# Altium footprint library LimeMicroAltiumLib_pcbLib_r05.PcbLib: 746 footprints (part 25 of 48)
Each footprint in its own frame and in the unit in brackets; x right, y up, seen from the top. Pads: shape width x height; smd on the part's side, far side on the other; paste and mask are expansions set on the pad; w line width, h text height; cw(c..) or ccw(c..) is an arc to the next point about the centre after c.
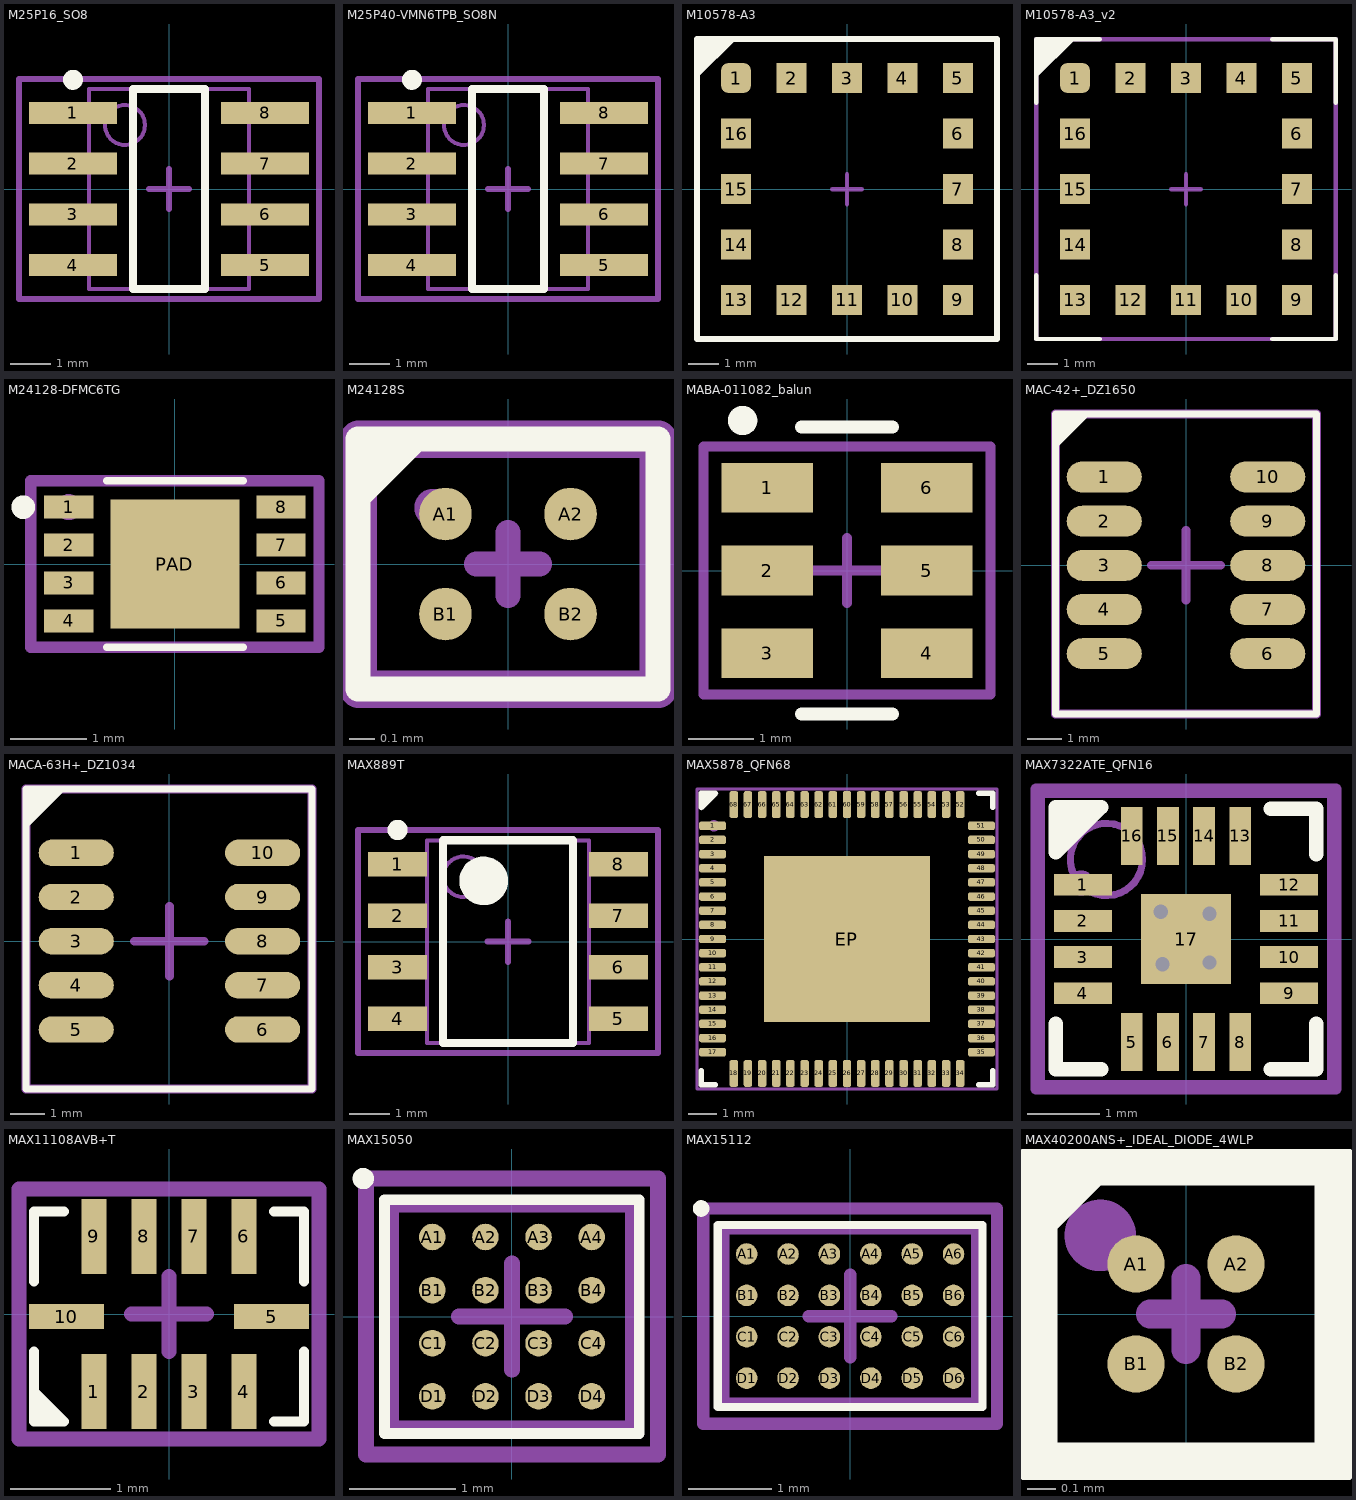
[diagram p24: the footprints below, top view; thin cyan lines are the x and y axes]

## M25P16_SO8 [mm] "SOIC, 8-Leads, Body 4,90x3,90mm, Pitch 1,27mm, IPC Medium Density"
height 1.7
pads (8):
  rect 2.2x0.55 smd: 1(-2.4,1.905) 2(-2.4,0.635) 3(-2.4,-0.635) 4(-2.4,-1.905) 5(2.4,-1.905) 6(2.4,-0.635) 7(2.4,0.635) 8(2.4,1.905)
Top Overlay:
  circle w0.25: c-2.4,2.73 r0.125
  lines w0.2: -0.9,-2.5 0.9,-2.5 0.9,2.5 -0.9,2.5 -0.9,-2.5
Mechanical 13:
  circle w0.1: c-1.1,1.6 r0.5
  lines w0.1: -2,-2.5 2,-2.5 2,2.5 -2,2.5 -2,-2.5
Mechanical 15:
  circle w0.2: c-2.5,1.9 r0.1
  lines w0.15: -0.5,0 0.5,0 ; 0,-0.5 0,0.5 ; -3.75,-2.75 3.75,-2.75 3.75,2.75 -3.75,2.75 -3.75,-2.75
  text ".Designator" at 0,0 h0.55
3D body "CircuitWorks-SO-8.step": height 1.45, standoff 0, extent -2.889,-2.45 2.889,2.452

## M25P40-VMN6TPB_SO8N [mm] "SOIC, 8-Leads, Body 4,90x3,90mm, Pitch 1,27mm, IPC Medium Density"
height 1.7
pads (8):
  rect 2.2x0.55 smd: 1(-2.4,1.905) 2(-2.4,0.635) 3(-2.4,-0.635) 4(-2.4,-1.905) 5(2.4,-1.905) 6(2.4,-0.635) 7(2.4,0.635) 8(2.4,1.905)
Top Overlay:
  circle w0.25: c-2.4,2.73 r0.125
  lines w0.2: -0.9,-2.5 0.9,-2.5 0.9,2.5 -0.9,2.5 -0.9,-2.5
Mechanical 13:
  circle w0.1: c-1.1,1.6 r0.5
  lines w0.1: -2,-2.5 2,-2.5 2,2.5 -2,2.5 -2,-2.5
Mechanical 15:
  circle w0.2: c-2.5,1.9 r0.1
  lines w0.15: -0.5,0 0.5,0 ; 0,-0.5 0,0.5 ; -3.75,-2.75 3.75,-2.75 3.75,2.75 -3.75,2.75 -3.75,-2.75
  text ".Designator" at 0,0 h0.55
3D body "CircuitWorks-SO-8.step": height 1.45, standoff 0, extent -2.889,-2.45 2.889,2.452

## M10578-A3 [mm] "RADIONOVA® RF Receiver GPS 1.575GHz -165dBm Module"
pads (16):
  rrect50% 1x1 smd mask+0.05: 1(-3.7,3.7)
  rect 1x1 smd mask+0.05: 2(-1.85,3.7) 3(0,3.7) 4(1.85,3.7) 5(3.7,3.7) 6(3.7,1.85) 7(3.7,0) 8(3.7,-1.85) 9(3.7,-3.7) 10(1.85,-3.7) 11(0,-3.7) 12(-1.85,-3.7) 13(-3.7,-3.7) 14(-3.7,-1.85) 15(-3.7,0) 16(-3.7,1.85)
Top Overlay:
  region: -5,5 -5,3.7 -3.7,5
  lines w0.2: -5,-5 -5,5 5,5 5,-5 -5,-5
Mechanical 15:
  circle w0.25: c-3.5,3.5 r0.1
  lines w0.15: -0.5,0 0.5,0 ; 0,-0.5 0,0.5 ; -5,-5 5,-5 5,5 -5,5 -5,-5
  text ".Designator" at 0,0 h0.55
3D body "M10578.STEP": height 1.3, standoff -0.52, extent -4.5,-4.5 4.5,4.5

## M10578-A3_v2 [mm] "RADIONOVA® RF Receiver GPS 1.575GHz -165dBm Module"
pads (16):
  rrect50% 1x1 smd mask+0.05: 1(-3.7,3.7)
  rect 1x1 smd mask+0.05: 2(-1.85,3.7) 3(0,3.7) 4(1.85,3.7) 5(3.7,3.7) 6(3.7,1.85) 7(3.7,0) 8(3.7,-1.85) 9(3.7,-3.7) 10(1.85,-3.7) 11(0,-3.7) 12(-1.85,-3.7) 13(-3.7,-3.7) 14(-3.7,-1.85) 15(-3.7,0) 16(-3.7,1.85)
Top Overlay:
  region: -5,5 -5,3.7 -3.7,5
  lines w0.15: -5,-2.875 -5,-5 -2.875,-5 ; -5,2.875 -5,5 -2.875,5 ; 2.875,-5 5,-5 5,-2.875 ; 2.875,5 5,5 5,2.875
Mechanical 15:
  circle w0.25: c-3.5,3.5 r0.1
  lines w0.15: -0.5,0 0.5,0 ; 0,-0.5 0,0.5 ; -5,-5 -5,5 5,5 5,-5 -5,-5
  text ".Designator" at 0,0 h0.55
3D body "M10578.STEP": height 1.3, standoff -0.52, extent -4.5,-4.5 4.5,4.5

## M24128-DFMC6TG [mm] "8-UFDFPN (2x3)"
pads (9):
  rect 0.65x0.3 smd mask+0.045: 1(-1.4,0.75) 2(-1.4,0.25) 3(-1.4,-0.25) 4(-1.4,-0.75) 5(1.4,-0.75) 6(1.4,-0.25) 7(1.4,0.25) 8(1.4,0.75)
  rect 1.7x1.7 smd mask+0.05: PAD(0,0)
Top Overlay:
  circle w0.2: c-2,0.75 r0.056
  lines w0.1: -0.9,-1.1 0.9,-1.1 ; -0.9,1.1 0.9,1.1
Mechanical 15:
  circle w0.2: c-1.4,0.75 r0.071
  lines w0.15: -0.3,0 0,0 ; 0,-0.3 0,0 ; 0,0.3 0,0 ; 0.3,0 0,0 ; -1.9,-1.1 -1.9,1.1 1.9,1.1 1.9,-1.1 -1.9,-1.1
  text ".Designator" at 0,0 h0.55
3D body "User Library-DFN-8-2.step": height 0.9, standoff 0, extent -1.523,-1.006 1.517,0.994

## M24128S [mm]
pads (4):
  round 0.21 smd mask+0.05: A1(-0.25,0.2) A2(0.25,0.2) B1(-0.25,-0.2) B2(0.25,-0.2)
Top Overlay:
  region: -0.6,0.2 -0.3,0.5 -0.6,0.5
  lines w0.1: -0.6,-0.5 0.6,-0.5 0.6,0.5 -0.6,0.5 -0.6,-0.5
Mechanical 15:
  circle w0.1: c-0.3,0.225 r0.025
  lines w0.1: -0.125,0 0,0 ; 0,-0.125 0,0 ; 0,0.125 0,0 ; 0.125,0 0,0
  lines w0.15: -0.6,-0.5 -0.6,0.5 0.6,0.5 0.6,-0.5 -0.6,-0.5
  text ".Designator" at 0,0 h0.55
3D body: height 0.32, standoff 0, extent -0.412,-0.35 0.413,0.35
3D body: height 0.33, standoff 0.32, extent -0.25,0.15 -0.15,0.25

## MABA-011082_balun [mm]
pads (6):
  rect 1.4x0.76 smd mask+0.05: 1(-1.225,1.27) 2(-1.225,0) 3(-1.225,-1.27) 4(1.225,-1.27) 5(1.225,0) 6(1.225,1.27)
Top Overlay:
  circle w0.25: c-1.6,2.3 r0.1
  lines w0.2: -0.7,-2.2 0.7,-2.2 ; -0.7,2.2 0.7,2.2
Mechanical 15:
  circle w0.25: c-1.6,1.3 r0.1
  lines w0.15: -0.5,0 0.5,0 ; 0,-0.5 0,0.5 ; -2.2,-1.9 -2.2,1.9 2.2,1.9 2.2,-1.9 -2.2,-1.9
  text ".Designator" at 0,0 h0.55
3D body "Coilcraft-JA4220-AL.step": height 3.03, standoff -0.02, extent -2.095,-2.225 2.095,2.225

## MAC-42+_DZ1650 [mm]
pads (10):
  oval 2.16x0.89 smd mask+0.05: 1(-2.35,2.54) 2(-2.35,1.27) 3(-2.35,0) 4(-2.35,-1.27) 5(-2.35,-2.54) 6(2.35,-2.54) 7(2.35,-1.27) 8(2.35,0) 9(2.35,1.27) 10(2.35,2.54)
Top Overlay:
  region: -2.75,4.35 -3.7,3.4 -3.7,4.35
  lines w0.2: -3.75,-4.275 -3.75,4.35 3.75,4.35 3.75,-4.275 -3.75,-4.275
Mechanical 15:
  circle w0.254: c-2.5,2.5 r0.125
  lines w0.254: -1,0 0,0 ; 0,-1 0,0 ; 0,1 0,0 ; 1,0 0,0 ; -3.75,-4.275 3.75,-4.275 3.75,4.35 -3.75,4.35 -3.75,-4.275
  text ".Designator" at 0,0 h0.55
3D body: height 1.53, standoff 0, extent -2.698,2.301 -2.3,2.7
3D body: height 1.52, standoff 0, extent -3.175,-3.9 3.175,3.9

## MACA-63H+_DZ1034 [mm]
pads (10):
  oval 2.16x0.76 smd mask+0.05: 1(-2.68,2.54) 2(-2.68,1.27) 3(-2.68,0) 4(-2.68,-1.27) 5(-2.68,-2.54) 6(2.68,-2.54) 7(2.68,-1.27) 8(2.68,0) 9(2.68,1.27) 10(2.68,2.54)
Top Overlay:
  region: -3.025,4.325 -4.125,3.225 -4.125,4.325
  lines w0.2: -4.125,-4.25 -4.125,4.375 4.1,4.375 4.1,-4.25 -4.125,-4.25
Mechanical 15:
  circle w0.254: c-2.5,2.5 r0.125
  lines w0.254: -1,0 0,0 ; 0,-1 0,0 ; 0,1 0,0 ; 1,0 0,0 ; -4.125,-4.25 4.1,-4.25 4.1,4.375 -4.125,4.375 -4.125,-4.25
  text ".Designator" at 0,0 h0.55
3D body: height 2.67, standoff 0, extent -3.175,-3.81 3.175,3.81
3D body: height 2.68, standoff 0, extent -2.698,2.301 -2.3,2.7

## MAX889T [mm] "SOIC, 8-Leads, Body 4,90x3,90mm, Pitch 1,27mm, IPC Medium Density"
height 1.75
pads (8):
  rect 1.45x0.6 smd: 1(-2.725,1.905) 2(-2.725,0.635) 3(-2.725,-0.635) 4(-2.725,-1.905) 5(2.725,-1.905) 6(2.725,-0.635) 7(2.725,0.635) 8(2.725,1.905)
Top Overlay:
  circle w0.6: c-0.6,1.5 r0.3
  circle w0.25: c-2.725,2.755 r0.125
  lines w0.2: -1.6,-2.5 1.6,-2.5 1.6,2.5 -1.6,2.5 -1.6,-2.5
Mechanical 13:
  circle w0.1: c-1.1,1.6 r0.5
  lines w0.1: -2,-2.5 2,-2.5 2,2.5 -2,2.5 -2,-2.5
Mechanical 15:
  circle w0.25: c-2.725,1.905 r0.125
  lines w0.15: -0.5,0 0.5,0 ; 0,-0.5 0,0.5 ; -3.7,-2.75 3.7,-2.75 3.7,2.75 -3.7,2.75 -3.7,-2.75
  text ".Designator" at -0.05,0 h0.55
3D body "SOIC-8.STEP": height 1.75, standoff 0, extent -3,-2.45 3,2.45

## MAX5878_QFN68 [mm]
pads (69):
  rrect50% 0.95x0.3 smd mask+0.05: 1(-4.75,4) 2(-4.75,3.5) 3(-4.75,3) 4(-4.75,2.5) 5(-4.75,2) 6(-4.75,1.5) 7(-4.75,1) 8(-4.75,0.5) 9(-4.75,0) 10(-4.75,-0.5) 11(-4.75,-1) 12(-4.75,-1.5) 13(-4.75,-2) 14(-4.75,-2.5) 15(-4.75,-3) 16(-4.75,-3.5) 17(-4.75,-4) 35(4.75,-4) 36(4.75,-3.5) 37(4.75,-3) 38(4.75,-2.5) 39(4.75,-2) 40(4.75,-1.5) 41(4.75,-1) 42(4.75,-0.5) 43(4.75,0) 44(4.75,0.5) 45(4.75,1) 46(4.75,1.5) 47(4.75,2) 48(4.75,2.5) 49(4.75,3) 50(4.75,3.5) 51(4.75,4)
  rrect50% 0.3x0.95 smd mask+0.05: 18(-4,-4.75) 19(-3.5,-4.75) 20(-3,-4.75) 21(-2.5,-4.75) 22(-2,-4.75) 23(-1.5,-4.75) 24(-1,-4.75) 25(-0.5,-4.75) 26(0,-4.75) 27(0.5,-4.75) 28(1,-4.75) 29(1.5,-4.75) 30(2,-4.75) 31(2.5,-4.75) 32(3,-4.75) 33(3.5,-4.75) 34(4,-4.75) 52(4,4.75) 53(3.5,4.75) 54(3,4.75) 55(2.5,4.75) 56(2,4.75) 57(1.5,4.75) 58(1,4.75) 59(0.5,4.75) 60(0,4.75) 61(-0.5,4.75) 62(-1,4.75) 63(-1.5,4.75) 64(-2,4.75) 65(-2.5,4.75) 66(-3,4.75) 67(-3.5,4.75) 68(-4,4.75)
  rect 5.85x5.85 smd paste-5 mask+0.05: EP(-0.001,-0.001)
Top Overlay:
  region: -5.15,4.55 -4.55,5.15 -5.15,5.15
  lines w0.2: -5.15,-4.65 -5.15,-5.15 -4.65,-5.15 ; 4.65,-5.15 5.15,-5.15 5.15,-4.65 ; 4.65,5.15 5.15,5.15 5.15,4.65 ; -5.15,4.65 -4.65,5.15 -5.15,5.15 -5.15,4.65
Top Paste:
  region: -0.781,0.78 0.78,0.78 0.78,-0.781 -0.781,-0.781
  region: -2.773,0.78 -1.21,0.78 -1.21,-0.781 -2.773,-0.781
  region: 1.213,0.78 2.77,0.78 2.77,-0.781 1.213,-0.781
  region: 1.211,2.77 2.77,2.77 2.77,1.211 1.211,1.211
  region: -0.782,2.77 0.78,2.77 0.78,1.213 -0.782,1.213
  region: -2.774,2.77 -1.21,2.77 -1.21,1.212 -2.774,1.212
  region: -2.773,-1.21 -1.21,-1.21 -1.21,-2.773 -2.773,-2.773
  region: -0.782,-1.21 0.78,-1.21 0.78,-2.777 -0.782,-2.777
  region: 1.214,-1.21 2.77,-1.21 2.77,-2.777 1.214,-2.777
Mechanical 15:
  circle w0.2: c-4.7,4 r0.1
  lines w0.1: -5.3,-5.3 5.3,-5.3 5.3,5.3 -5.3,5.3 -5.3,-5.3
  lines w0.15: -0.9,0 0,0 ; 0,-0.9 0,0 ; 0,0.9 0,0 ; 0.9,0 0,0
  text ".Designator" at 0,0 h0.55
3D body: height 0.95, standoff 0.9, extent -4.598,4.2 -4.2,4.6
3D body: height 0.9, standoff 0, extent -5,-5 5,5

## MAX7322ATE_QFN16 [mm]
height 0.8
pads (17):
  rect 0.8x0.3 smd mask+0.05: 1(-1.425,0.75) 2(-1.425,0.25) 3(-1.425,-0.25) 4(-1.425,-0.75) 9(1.425,-0.75) 10(1.425,-0.25) 11(1.425,0.25) 12(1.425,0.75)
  rect 0.3x0.8 smd mask+0.05: 5(-0.75,-1.425) 6(-0.25,-1.425) 7(0.25,-1.425) 8(0.75,-1.425) 13(0.75,1.425) 14(0.25,1.425) 15(-0.25,1.425) 16(-0.75,1.425)
  rect 1.25x1.25 smd mask+0.05: 17(0,0)
via -0.325,-0.35 diameter 0.4 hole 0.2
via 0.325,-0.325 diameter 0.4 hole 0.2
via 0.325,0.35 diameter 0.4 hole 0.2
via -0.35,0.375 diameter 0.4 hole 0.2
Top Overlay:
  region: -1.8,1.2 -1.175,1.825 -1.8,1.825
  lines w0.2: -1.8,-1.175 -1.8,-1.8 -1.175,-1.8 ; 1.175,-1.8 1.8,-1.8 1.8,-1.175 ; 1.175,1.8 1.8,1.8 1.8,1.175 ; -1.8,1.2 -1.8,1.825 -1.175,1.825 -1.8,1.2
Top Solder:
  region: -1.05,0.95 -0.95,1.05 -0.875,0.975 -0.975,0.875
  region: 1.05,0.95 0.95,1.05 0.875,0.975 0.975,0.875
  region: 1.05,-0.95 0.95,-1.05 0.875,-0.975 0.975,-0.875
  region: -1.05,-0.95 -0.95,-1.05 -0.875,-0.975 -0.975,-0.875
Mechanical 13:
  circle w0.1: c-1.1,1.1 r0.5
  lines w0.1: -2,-2 -2,2 2,2 2,-2 -2,-2
Mechanical 15:
  circle w0.35: c-1.45,0.775 r0
  region: -1.8,1.1
  lines w0.15: -0.5,0 0.5,0 ; 0,-0.5 0,0.5 ; -2.075,-2.075 -2.075,2.075 2.075,2.075 2.075,-2.075 -2.075,-2.075
  text ".Designator" at 0,0 h0.55
3D body "User Library-qfn16-3x3.step": height 0.92, standoff 0, extent -1.5,-1.5 1.5,1.5

## MAX11108AVB+T [mm]
pads (10):
  rect 0.25x0.75 smd mask+0.05: 1(-0.75,-0.775) 2(-0.25,-0.775) 3(0.25,-0.775) 4(0.75,-0.775) 6(0.75,0.775) 7(0.25,0.775) 8(-0.25,0.775) 9(-0.75,0.775)
  rect 0.75x0.25 smd mask+0.05: 5(1.025,-0.025) 10(-1.025,-0.025)
Top Overlay:
  region: -1.05,-1.075 -1.35,-0.775 -1.35,-1.075
  lines w0.1: -1.35,-0.375 -1.35,-1.075 -1.05,-1.075 -1.35,-0.775 ; -1.35,0.325 -1.35,1.025 -1.05,1.025 ; 1.05,-1.075 1.35,-1.075 1.35,-0.375 ; 1.05,1.025 1.35,1.025 1.35,0.325 ; -1.35,-0.775 -1.35,-0.775
Mechanical 15:
  circle w0.1: c-0.75,-0.75 r0.035
  lines w0.15: -0.375,0 0,0 ; 0,-0.375 0,0 ; 0,0.375 0,0 ; 0.375,0 0,0 ; -1.5,-1.25 1.4,-1.25 1.5,-1.25 1.5,1.15 1.5,1.25 -1.5,1.25 -1.5,-1.25
  text ".Designator" at 0,0 h0.55
3D body: height 0.5, standoff 0.45, extent -0.874,-0.625 -0.575,-0.325
3D body: height 0.45, standoff 0, extent -1.05,-0.8 1.05,0.8

## MAX15050 [mm] "BGA, 16-Leads, Body 2,22x2,06mmx0,25mm, Pitch 0,50mm"
height 0.25
pads (16):
  round 0.25 smd: A1(-0.75,0.75) A2(-0.25,0.75) A3(0.25,0.75) A4(0.75,0.75) B1(-0.75,0.25) B2(-0.25,0.25) B3(0.25,0.25) B4(0.75,0.25) C1(-0.75,-0.25) C2(-0.25,-0.25) C3(0.25,-0.25) C4(0.75,-0.25) D1(-0.75,-0.75) D2(-0.25,-0.75) D3(0.25,-0.75) D4(0.75,-0.75)
Top Overlay:
  circle w0.1: c-1.4,1.3 r0.05
  lines w0.1: -1.2,-1.1 -1.2,1.1 1.2,1.1 1.2,-1.1 -1.2,-1.1
Mechanical 13:
  lines w0.1: -1.115,-1.03 -1.115,1.03 1.115,1.03 1.115,-1.03 -1.115,-1.03
Mechanical 15:
  lines w0.15: -0.5,0 0.5,0 ; 0,-0.5 0,0.5 ; -1.375,-1.3 -1.375,1.3 1.375,1.3 1.375,-1.3 -1.375,-1.3
  text ".Designator" at 0,0 h0.55
  text "A1" at -1,0.6 h0.3
3D body: height 0.25, standoff 0.25, extent -1.115,-1.03 1.115,1.03

## MAX15112 [mm] "BGA, 24-Leads, Body 3,02x2,07mmx0,25mm, Pitch 0,50mm"
height 0.25
pads (24):
  round 0.26 smd: A1(-1.25,0.75) A2(-0.75,0.75) A3(-0.25,0.75) A4(0.25,0.75) A5(0.75,0.75) A6(1.25,0.75) B1(-1.25,0.25) B2(-0.75,0.25) B3(-0.25,0.25) B4(0.25,0.25) B5(0.75,0.25) B6(1.25,0.25) C1(-1.25,-0.25) C2(-0.75,-0.25) C3(-0.25,-0.25) C4(0.25,-0.25) C5(0.75,-0.25) C6(1.25,-0.25) D1(-1.25,-0.75) D2(-0.75,-0.75) D3(-0.25,-0.75) D4(0.25,-0.75) D5(0.75,-0.75) D6(1.25,-0.75)
Top Overlay:
  circle w0.1: c-1.8,1.3 r0.05
  lines w0.1: -1.6,-1.1 -1.6,1.1 1.6,1.1 1.6,-1.1 -1.6,-1.1
Mechanical 13:
  lines w0.1: -1.51,-1.035 -1.51,1.035 1.51,1.035 1.51,-1.035 -1.51,-1.035
Mechanical 15:
  lines w0.15: -0.5,0 0.5,0 ; 0,-0.5 0,0.5 ; -1.775,-1.3 -1.775,1.3 1.775,1.3 1.775,-1.3 -1.775,-1.3
  text "A1" at -1.4,0.6 h0.3
  text ".Designator" at 0,0 h0.55
3D body: height 0.25, standoff 0.25, extent -1.51,-1.035 1.51,1.035

## MAX40200ANS+_IDEAL_DIODE_4WLP [mm]
pads (4):
  round 0.2 smd paste+0 mask+0.05: A1(-0.175,0.175) A2(0.175,0.175) B1(-0.175,-0.175) B2(0.175,-0.175)
Top Overlay:
  region: -0.525,0.225 -0.525,0.525 -0.225,0.525
  lines w0.15: -0.525,-0.525 -0.525,0.525 0.525,0.525 0.525,-0.525 -0.525,-0.525
Mechanical 15:
  circle w0.2: c-0.3,0.275 r0.025
  lines w0.1: -0.125,0 0,0 ; 0,-0.125 0,0 ; 0,0.125 0,0 ; 0.125,0 0,0 ; -0.525,-0.525 -0.525,0.525 0.525,0.525 0.525,-0.525 -0.525,-0.525
  text ".Designator" at 0,0 h0.55
3D body: height 0.2, standoff -0.05, extent 0.058,0.052 0.3,0.298
3D body: height 0.2, standoff -0.05, extent 0.058,-0.298 0.3,-0.052
3D body: height 0.2, standoff -0.05, extent -0.292,0.052 -0.05,0.298
3D body: height 0.2, standoff -0.05, extent -0.292,-0.298 -0.05,-0.052
3D body: height 0.5, standoff 0.16, extent -0.375,-0.375 0.375,0.375